# Altium footprint library HARTING THD.PcbLib: 113 footprints (part 10 of 11) (continued)
## HARTING_16 25 170 1301 000 [mm] "170 Poles, Piggyback Plug Connector (Basic Side)" (continued)
  round 1 hole 1.8 unplated mask+0.4: 171(-33.3,0) 172(33.3,0)
Top Overlay:
  lines w0.2: -34.95,-2.3 -34.95,2.2 cw(c-34.55,2.2) -34.55,2.6 -32.926,2.596 ccw(c-32.931,3.003) -32.525,3 -32.525,4.9 cw(c-32.025,4.9) -32.025,5.4 32.025,5.4 cw(c32.025,4.9) 32.525,4.9 32.525,3 ccw(c32.925,3) 32.925,2.6 34.55,2.6 cw(c34.55,2.2) 34.95,2.2 34.95,-2.75 ; -33.5,-15.5 ccw(c-33,-15.5) -33,-16 -32.525,-16 -32.525,-25.293 ccw(c-32.025,-25.293) -32.379,-25.646 -32.026,-25.994 ccw(c-31.718,-25.6) -31.718,-26.1 31.718,-26.1 ccw(c31.718,-25.6) 32.026,-25.994 32.379,-25.646 ccw(c32.025,-25.293) 32.525,-25.293 32.525,-16 33,-16 ccw(c33,-15.5) 33.5,-15.5 ; -33.5,-1.234 -33.5,-2 -33.1,-2 -33.1,-1.234 ; -33.5,1.234 -33.5,2 -33.1,2 -33.1,1.234 ; 33.1,-1.234 33.1,-2 33.5,-2 33.5,-1.234 ; 33.1,1.234 33.1,2 33.5,2 33.5,1.234 ; -31.74,-25.38 -31.74,-21.468 -31.26,-21.468 -31.26,-25.38 -31.74,-25.38 ; -30.99,-23.98 -30.99,-21.468 -30.51,-21.468 -30.51,-23.98 -30.99,-23.98 ; -30.24,-23.98 -29.76,-23.98 -29.76,-21.468 -30.24,-21.468 -30.24,-23.98 ; -29.49,-25.38 -29.01,-25.38 -29.01,-21.468 -29.49,-21.468 -29.49,-25.38 ; -28.74,-23.98 -28.74,-21.468 -28.26,-21.468 -28.26,-23.98 -28.74,-23.98 ; -27.99,-23.98 -27.51,-23.98 -27.51,-21.468 -27.99,-21.468 -27.99,-23.98 ; 27.51,-23.98 27.51,-21.468 27.99,-21.468 27.99,-23.98 27.51,-23.98 ; 28.26,-23.98 28.26,-21.468 28.74,-21.468 28.74,-23.98 28.26,-23.98 ; 29.01,-23.98 29.01,-21.468 29.49,-21.468 29.49,-23.98 29.01,-23.98 ; 29.76,-23.98 29.76,-21.468 30.24,-21.468 30.24,-23.98 29.76,-23.98 ; 30.51,-23.98 30.51,-21.468 30.99,-21.468 30.99,-23.98 30.51,-23.98 ; 31.26,-25.38 31.26,-21.468 31.74,-21.468 31.74,-25.38 31.26,-25.38
  text "1" at 33.25,3.3 h1.2
Mechanical 8:
  drawing of 735 lines, arcs and shapes, not listed
  text "86" at -31.156,-2.186 h0.5
  text "89" at -28.931,-2.226 h0.5
  text "88" at -29.75,-0.85 h0.5
  text "87" at -30.405,0.369 h0.5
  text "85" at -31.097,1.636 h0.5
  text "84" at -30.367,2.938 h0.5
  text "83" at -29.713,4.371 h0.5
  text "82" at -28.854,1.645 h0.5
  text "2" at 31.189,4.373 h0.5
  text "3" at 30.339,3.029 h0.5
  text "4" at 29.53,1.748 h0.5
  text "1" at 31.62,1.758 h0.5
  text "168" at 30.244,0.414 h0.5
  text "169" at 30.879,-0.767 h0.5
  text "170" at 31.69,-2.201 h0.5
  text "167" at 29.553,-2.214 h0.5
  text "PCB Edge" at -5.2,-14.4 h1.52
Mechanical 14:
  circle w0.1: c-33.645,-7.5 r0.735
  circle w0.1: c33.645,-7.5 r0.735
  lines w0.1: -34.95,-6.5 cw(c-34.45,-6.5) -34.45,-6 -32.65,-6 cw(c-32.65,-6.5) -32.15,-6.5 -32.15,-8.5 cw(c-32.65,-8.5) -32.65,-9 -34.45,-9 cw(c-34.45,-8.5) -34.95,-8.5 -34.95,2.2 cw(c-34.55,2.2) -34.55,2.6 -32.926,2.596 ccw(c-32.931,3.003) -32.525,3 -32.525,4.9 cw(c-32.025,4.9) -32.025,5.4 32.025,5.4 cw(c32.025,4.9) 32.525,4.9 32.525,3 ccw(c32.925,3) 32.925,2.6 34.55,2.6 cw(c34.55,2.2) 34.95,2.2 34.95,-8.5 cw(c34.45,-8.5) 34.45,-9 32.65,-9 cw(c32.65,-8.5) 32.15,-8.5 32.15,-6.5 cw(c32.65,-6.5) 32.65,-6 34.45,-6 cw(c34.45,-6.5) 34.95,-6.5 ; -34.95,1.784 -33.5,1.784 ; -33.1,1.784 -32.025,1.784 -32.025,4.8 32.025,4.8 32.025,1.784 33.1,1.784 ; -32.825,-9 cw(c-32.825,-9.3) -32.525,-9.3 -32.525,-25.293 ccw(c-32.025,-25.293) -32.379,-25.646 -32.026,-25.994 ccw(c-31.718,-25.6) -31.718,-26.1 31.718,-26.1 ccw(c31.718,-25.6) 32.026,-25.994 32.379,-25.646 ccw(c32.025,-25.293) 32.525,-25.293 32.525,-9.3 cw(c32.825,-9.3) 32.825,-9 ; -16,4.779 -16,2.546 -15.5,2.546 -15.5,4.8 ; -0.25,4.8 -0.25,2.546 0.25,2.546 0.25,4.8 ; 15.5,4.8 15.5,2.546 16,2.546 16,4.8 ; 33.5,1.784 34.95,1.784 ; -33.5,-2 -33.5,2 -33.1,2 -33.1,-2 -33.5,-2 ; -31.74,-25.38 -31.26,-25.38 -31.26,-21.468 -31.74,-21.468 -31.74,-25.38 ; -30.99,-23.98 -30.51,-23.98 -30.51,-21.468 -30.99,-21.468 -30.99,-23.98 ; -30.24,-23.98 -30.24,-21.468 -29.76,-21.468 -29.76,-23.98 -30.24,-23.98 ; -29.49,-25.38 -29.49,-21.468 -29.01,-21.468 -29.01,-25.38 -29.49,-25.38 ; -28.74,-23.98 -28.26,-23.98 -28.26,-21.468 -28.74,-21.468 -28.74,-23.98 ; -27.99,-23.98 -27.99,-21.468 -27.51,-21.468 -27.51,-23.98 -27.99,-23.98 ; 27.51,-23.98 27.99,-23.98 27.99,-21.468 27.51,-21.468 27.51,-23.98 ; 28.26,-23.98 28.74,-23.98 28.74,-21.468 28.26,-21.468 28.26,-23.98 ; 29.01,-23.98 29.49,-23.98 29.49,-21.468 29.01,-21.468 29.01,-23.98 ; 29.76,-23.98 30.24,-23.98 30.24,-21.468 29.76,-21.468 29.76,-23.98 ; 30.51,-23.98 30.99,-23.98 30.99,-21.468 30.51,-21.468 30.51,-23.98 ; 31.26,-25.38 31.74,-25.38 31.74,-21.468 31.26,-21.468 31.26,-25.38 ; 33.1,-2 33.5,-2 33.5,2 33.1,2 33.1,-2
  text "1" at 33.25,3.3 h1.2
3D body "HARTING_16 25 170 1301 000.stp": height 7.59, standoff -2.63, extent -34.95,-26.1 34.95,5.4

## HARTING_16 33 096 1201 000 [mm] "Thru-Hole Press-in Terminations, Lead 3.7 mm, 96 Positions (72+24), Straight Micro TCA Female Connector"
height 17.2
pads (168):
  round 1.1 hole 0.6: A1(11.12,-21.25) A2(11.12,-23.25) A3(11.12,-25.25) A4(11.12,-27.25) A5(11.12,-29.25) A6(11.12,-31.25) A7(11.12,-33.25) A8(11.12,-35.25) A9(11.12,-37.25) B1(9.12,-21.25) B2(9.12,-23.25) B3(9.12,-25.25) B4(9.12,-27.25) B5(9.12,-29.25) B6(9.12,-31.25) B7(9.12,-33.25) B8(9.12,-35.25) B9(9.12,-37.25) C1(7.12,-21.25) C2(7.12,-23.25) C3(7.12,-25.25) C4(7.12,-27.25) C5(7.12,-29.25) C6(7.12,-31.25) C7(7.12,-33.25) C8(7.12,-35.25) C9(7.12,-37.25) D1(5.12,-21.25) D2(5.12,-23.25) D3(5.12,-25.25) D4(5.12,-27.25) D5(5.12,-29.25) D6(5.12,-31.25) D7(5.12,-33.25) D8(5.12,-35.25) D9(5.12,-37.25) E1(3.12,-21.25) E2(3.12,-23.25) E3(3.12,-25.25) E4(3.12,-27.25) E5(3.12,-29.25) E6(3.12,-31.25) E7(3.12,-33.25) E8(3.12,-35.25) E9(3.12,-37.25) F1(1.12,-21.25) F2(1.12,-23.25) F3(1.12,-25.25) F4(1.12,-27.25) F5(1.12,-29.25) F6(1.12,-31.25) F7(1.12,-33.25) F8(1.12,-35.25) F9(1.12,-37.25) G1(-0.88,-21.25) G2(-0.88,-23.25) G3(-0.88,-25.25) G4(-0.88,-27.25) G5(-0.88,-29.25) G6(-0.88,-31.25) G7(-0.88,-33.25) G8(-0.88,-35.25) G9(-0.88,-37.25) H1(-2.88,-21.25) H2(-2.88,-23.25) H3(-2.88,-25.25) H4(-2.88,-27.25) H5(-2.88,-29.25) H6(-2.88,-31.25) H7(-2.88,-33.25) H8(-2.88,-35.25) H9(-2.88,-37.25) P1(2.25,16.5) P1(4.25,16.5) P1(7.25,16.5) P1(9.25,16.5) P2(2.25,13.5) P2(4.25,13.5) P2(7.25,13.5) P2(9.25,13.5) P3(2.25,10.5) P3(4.25,10.5) P3(7.25,10.5) P3(9.25,10.5) P4(2.25,7.5) P4(4.25,7.5) P4(7.25,7.5) P4(9.25,7.5) P5(2.25,4.5) P5(4.25,4.5) P5(7.25,4.5) P5(9.25,4.5) P6(2.25,1.5) P6(4.25,1.5) P6(7.25,1.5) P6(9.25,1.5) P7(2.25,-1.5) P7(4.25,-1.5) P7(7.25,-1.5) P7(9.25,-1.5) P8(2.25,-4.5) P8(4.25,-4.5) P8(7.25,-4.5) P8(9.25,-4.5) P9(2.25,-7.5) P9(4.25,-7.5) P9(7.25,-7.5) P9(9.25,-7.5) P10(2.25,-10.5) P10(4.25,-10.5) P10(7.25,-10.5) P10(9.25,-10.5) P11(2.25,-13.5) P11(4.25,-13.5) P11(7.25,-13.5) P11(9.25,-13.5) P12(2.25,-16.5) P12(4.25,-16.5) P12(7.25,-16.5) P12(9.25,-16.5) P13(-9.25,16.5) P13(-7.25,16.5) P13(-4.25,16.5) P13(-2.25,16.5) P14(-9.25,13.5) P14(-7.25,13.5) P14(-4.25,13.5) P14(-2.25,13.5) P15(-9.25,10.5) P15(-7.25,10.5) P15(-4.25,10.5) P15(-2.25,10.5) P16(-9.25,7.5) P16(-7.25,7.5) P16(-4.25,7.5) P16(-2.25,7.5) P17(-9.25,4.5) P17(-7.25,4.5) P17(-4.25,4.5) P17(-2.25,4.5) P18(-9.25,1.5) P18(-7.25,1.5) P18(-4.25,1.5) P18(-2.25,1.5) P19(-9.25,-1.5) P19(-7.25,-1.5) P19(-4.25,-1.5) P19(-2.25,-1.5) P20(-9.25,-4.5) P20(-7.25,-4.5) P20(-4.25,-4.5) P20(-2.25,-4.5) P21(-9.25,-7.5) P21(-7.25,-7.5) P21(-4.25,-7.5) P21(-2.25,-7.5) P22(-9.25,-10.5) P22(-7.25,-10.5) P22(-4.25,-10.5) P22(-2.25,-10.5) P23(-9.25,-13.5) P23(-7.25,-13.5) P23(-4.25,-13.5) P23(-2.25,-13.5) P24(-9.25,-16.5) P24(-7.25,-16.5) P24(-4.25,-16.5) P24(-2.25,-16.5)
Top Overlay:
  circle w0.2: c-9.5,-34.75 r1.99
  circle w0.2: c-9.5,-34.75 r0.99
  lines w0.2: -11.65,-18.9 -8.65,-18.9 -8.65,-17.78 -5.92,-17.78 -5.92,-40.7 ; -11.65,20.4 -7.67,20.4 ; -10.65,20.4 -10.65,21.45 cw(c-9.66,21.45) -8.67,21.45 -8.67,20.4 ; -5.92,-18.9 -4.97,-18.9 ; 11.65,-18.9 11.65,20.4 8.65,20.4 8.65,19.48 1.5,19.48 1.5,20.4 -1.5,20.4 -1.5,19.48 -7.67,19.48 -7.67,21.45 ccw(c-9.66,21.45) -11.65,21.45 -11.65,-40.7 13.69,-40.7 13.69,-18.9 8.65,-18.9 8.65,-17.78 -4.97,-17.78 -4.97,-39.5 13.02,-39.5 13.02,-18.9
  text "P24" at -12.25,-17.88 h1.2
  text "P13" at -12.25,15.275 h1.2
  text "P12" at 13.45,-17.736 h1.2
  text "P1" at 13.45,15.72 h1.2
  text "9" at 15.42,-37.69 h1.2
  text "8" at 15.42,-35.67 h1.2
  text "7" at 15.42,-33.67 h1.2
  text "6" at 15.42,-31.664 h1.2
  text "5" at 15.42,-29.695 h1.2
  text "4" at 15.42,-27.73 h1.2
  text "3" at 15.42,-25.695 h1.2
  text "2" at 15.42,-23.691 h1.2
  text "1" at 15.42,-21.55 h1.2
  text "A" at 11.72,-42.042 h1.2
  text "B" at 9.72,-42.042 h1.2
  text "C" at 7.72,-42.042 h1.2
  text "D" at 5.72,-42.07 h1.2
  text "E" at 3.72,-42.07 h1.2
  text "F" at 1.72,-42.07 h1.2
  text "G" at -0.28,-42.099 h1.2
  text "H" at -2.28,-42.099 h1.2
Mechanical 8:
  drawing of 676 lines, arcs and shapes, not listed
Mechanical 14:
  drawing of 158 lines, arcs and shapes, not listed
  text "B" at 7.8,18.108 h0.9
  text "C" at 4.85,18.108 h0.9
  text "D" at 2.9,18.108 h0.9
  text "A" at 9.6,18.1 h0.9
  text "A" at -1.9,18.1 h0.9
  text "D" at -8.6,18.108 h0.9
  text "C" at -6.65,18.108 h0.9
  text "B" at -3.7,18.108 h0.9
  text "P24" at -10.2,-18.1 h0.9
  text "P23" at -10.15,-14.845 h0.9
  text "P22" at -10.15,-11.856 h0.9
  text "P21" at -10.15,-8.7 h0.9
  text "P20" at -10.15,-5.82 h0.9
  text "P19" at -10.15,-2.743 h0.9
  text "P18" at -10.15,0.3 h0.9
  text "P17" at -10.15,3.3 h0.9
  text "P16" at -10.15,6.27 h0.9
  text "P15" at -10.15,9.275 h0.9
  text "P14" at -10.15,12.24 h0.9
  text "P13" at -10.15,15.275 h0.9
  text "P12" at 11.35,-17.736 h0.9
  text "P11" at 11.35,-14.58 h0.9
  text "P10" at 11.35,-11.7 h0.9
  text "P9" at 11.35,-8.443 h0.9
  text "P8" at 11.35,-5.4 h0.9
  text "P7" at 11.35,-2.4 h0.9
  text "P6" at 11.35,0.57 h0.9
  text "P5" at 11.35,3.575 h0.9
  text "P4" at 11.35,6.54 h0.9
  text "P3" at 11.35,9.575 h0.9
  text "P2" at 11.35,12.564 h0.9
  text "P1" at 11.35,15.72 h0.9
  text "1" at 12.72,-21.55 h0.9
  text "2" at 12.72,-23.691 h0.9
  text "3" at 12.72,-25.695 h0.9
  text "4" at 12.72,-27.73 h0.9
  text "5" at 12.72,-29.695 h0.9
  text "6" at 12.72,-31.664 h0.9
  text "7" at 12.72,-33.67 h0.9
  text "8" at 12.72,-35.67 h0.9
  text "9" at 12.72,-37.69 h0.9
  text "H" at -2.28,-39.16 h0.9
  text "G" at -0.28,-39.17 h0.9
  text "F" at 1.72,-39.16 h0.9
  text "E" at 3.72,-39.16 h0.9
  text "D" at 5.72,-39.17 h0.9
  text "C" at 7.72,-39.17 h0.9
  text "B" at 9.72,-39.16 h0.9
  text "A" at 11.72,-39.17 h0.9
Drill Drawing:
  lines w0.1: -11.65,-17.836 -11.65,18.4 11,18.4 11,-18.9 12.7,-18.9 12.7,-38.47 -4.3,-38.47 -4.3,-17.78 -11.65,-17.78
  text "PRESS-FIT TECHNOLOGY  diam. 0.6mm +0.05 -0" at 0.3,-18.7 h1
3D body "HARTING_16 33 096 1201 000.stp": height 17, standoff -3.7, extent -11.65,-40.7 13.69,23.44

## HARTING_16 79 000 0020 000 [mm] "Quad Length (22.5mm) Stacking Pin For 1x AdvancedMC Basic Side + 2x MCH-Plug Basic Side + 1x Piggyback Connector (Basic Side)"
height 22.5
Top Overlay:
  circle w0.2: c0,0 r0.75
Mechanical 8:
  lines w0.1: -0.5,0 0,0 ; 0,-0.5 0,0 ; 0,0.5 0,0 ; 0.5,0 0,0
Mechanical 14:
  circle w0.1: c0,0 r0.75
3D body "HARTING_16 79 000 0020 000.stp": height 22.5, standoff 0, extent -0.75,-0.75 0.75,0.75

## HARTING_17 05 095 1201 [mm] "Har-bus HM Type B19, 95 Contacts (abcde), Pitch 2mm, 3.7mm Press-in Terminations, Male Straight Connector (VME, Position P0)"
height 13.4
pads (95):
  round 1.1 hole 0.6: a1(0,0) a2(0,-2) a3(0,-4) a4(0,-6) a5(0,-8) a6(0,-10) a7(0,-12) a8(0,-14) a9(0,-16) a10(0,-18) a11(0,-20) a12(0,-22) a13(0,-24) a14(0,-26) a15(0,-28) a16(0,-30) a17(0,-32) a18(0,-34) a19(0,-36) b1(2,0) b2(2,-2) b3(2,-4) b4(2,-6) b5(2,-8) b6(2,-10) b7(2,-12) b8(2,-14) b9(2,-16) b10(2,-18) b11(2,-20) b12(2,-22) b13(2,-24) b14(2,-26) b15(2,-28) b16(2,-30) b17(2,-32) b18(2,-34) b19(2,-36) c1(4,0) c2(4,-2) c3(4,-4) c4(4,-6) c5(4,-8) c6(4,-10) c7(4,-12) c8(4,-14) c9(4,-16) c10(4,-18) c11(4,-20) c12(4,-22) c13(4,-24) c14(4,-26) c15(4,-28) c16(4,-30) c17(4,-32) c18(4,-34) c19(4,-36) d1(6,0) d2(6,-2) d3(6,-4) d4(6,-6) d5(6,-8) d6(6,-10) d7(6,-12) d8(6,-14) d9(6,-16) d10(6,-18) d11(6,-20) d12(6,-22) d13(6,-24) d14(6,-26) d15(6,-28) d16(6,-30) d17(6,-32) d18(6,-34) d19(6,-36) e1(8,0) e2(8,-2) e3(8,-4) e4(8,-6) e5(8,-8) e6(8,-10) e7(8,-12) e8(8,-14) e9(8,-16) e10(8,-18) e11(8,-20) e12(8,-22) e13(8,-24) e14(8,-26) e15(8,-28) e16(8,-30) e17(8,-32) e18(8,-34) e19(8,-36)
Top Overlay:
  drawing of 166 lines, arcs and shapes, not listed
  text "e" at 7.667,1.667 h1.2
  text "a" at -0.333,1.667 h1.2
  text "b" at 1.667,1.5 h1.2
  text "c" at 3.667,1.667 h1.2
  text "d" at 5.667,1.5 h1.2
  text "1" at -4.7,-0.3 h1.2
  text "19" at -6.2,-36.6 h1.2
Mechanical 8:
  lines w0.05: -0.5,-36 0,-36 ; -0.5,-34 0,-34 ; -0.5,-2 0,-2 ; -0.5,0 0,0 ; 0,-36.5 0,-36 ; 0,-35.5 0,-36 ; 0,-34.5 0,-34 ; 0,-33.5 0,-34 ; 0,-2.5 0,-2 ; 0,-1.5 0,-2 ; 0,-0.5 0,0 ; 0,0.5 0,0 ; 0.5,-36 0,-36 ; 0.5,-34 0,-34 ; 0.5,-2 0,-2 ; 0.5,0 0,0 ; 1.5,-36 2,-36 ; 1.5,-34 2,-34 ; 1.5,-2 2,-2 ; 1.5,0 2,0 ; 2,-36.5 2,-36 ; 2,-35.5 2,-36 ; 2,-34.5 2,-34 ; 2,-33.5 2,-34 ; 2,-2.5 2,-2 ; 2,-1.5 2,-2 ; 2,-0.5 2,0 ; 2,0.5 2,0 ; 2.5,-36 2,-36 ; 2.5,-34 2,-34 ; 2.5,-2 2,-2 ; 2.5,0 2,0 ; 3.5,-36 4,-36 ; 3.5,-34 4,-34 ; 3.5,-18 4,-18 ; 3.5,-2 4,-2 ; 3.5,0 4,0 ; 4,-36.5 4,-36 ; 4,-35.5 4,-36 ; 4,-34.5 4,-34 ; 4,-33.5 4,-34 ; 4,-18.5 4,-18 ; 4,-17.5 4,-18 ; 4,-2.5 4,-2 ; 4,-1.5 4,-2 ; 4,-0.5 4,0 ; 4,0.5 4,0 ; 4.5,-36 4,-36 ; 4.5,-34 4,-34 ; 4.5,-18 4,-18 ; 4.5,-2 4,-2 ; 4.5,0 4,0 ; 5.5,-36 6,-36 ; 5.5,-34 6,-34 ; 5.5,-2 6,-2 ; 5.5,0 6,0 ; 6,-36.5 6,-36 ; 6,-35.5 6,-36 ; 6,-34.5 6,-34 ; 6,-33.5 6,-34 ; 6,-2.5 6,-2 ; 6,-1.5 6,-2 ; 6,-0.5 6,0 ; 6,0.5 6,0 ; 6.5,-36 6,-36 ; 6.5,-34 6,-34 ; 6.5,-2 6,-2 ; 6.5,0 6,0 ; 7.5,-36 8,-36 ; 7.5,-34 8,-34 ; 7.5,-2 8,-2 ; 7.5,0 8,0 ; 8,-36.5 8,-36 ; 8,-35.5 8,-36 ; 8,-34.5 8,-34 ; 8,-33.5 8,-34 ; 8,-2.5 8,-2 ; 8,-1.5 8,-2 ; 8,-0.5 8,0 ; 8,0.5 8,0 ; 8.5,-36 8,-36 ; 8.5,-34 8,-34 ; 8.5,-2 8,-2 ; 8.5,0 8,0
Mechanical 14:
  drawing of 186 lines, arcs and shapes, not listed
  text "e" at 7.667,1.667 h1.2
  text "1" at -4.7,-0.3 h1.2
  text "d" at 5.667,1.5 h1.2
  text "c" at 3.667,1.667 h1.2
  text "b" at 1.667,1.5 h1.2
  text "a" at -0.333,1.667 h1.2
  text "19" at -6.2,-36.6 h1.2
Drill Drawing:
  lines w0.1: -1,-37 9,-37 9,1 -1,1 -1,-37
  text "PRESS-FIT TECHNOLOGY diam. 0.6mm +/- 0.05" at 10.55,-36.375 h1
3D body "HARTING_17 05 095 1201.stp": height 13.4, standoff -3.7, extent -3.7,-37 11.7,1

## HARTING_17 25 095 2101 [mm] "Type B19, 95 Contacts (abcde) Female Connector, Angled, HAR-BUS HM without Upper Shield (VME, Position P0)"
height 7.3
pads (95):
  round 1.1 hole 0.6: a1(0,0) a2(0,-2) a3(0,-4) a4(0,-6) a5(0,-8) a6(0,-10) a7(0,-12) a8(0,-14) a9(0,-16) a10(0,-18) a11(0,-20) a12(0,-22) a13(0,-24) a14(0,-26) a15(0,-28) a16(0,-30) a17(0,-32) a18(0,-34) a19(0,-36) b1(-2,0) b2(-2,-2) b3(-2,-4) b4(-2,-6) b5(-2,-8) b6(-2,-10) b7(-2,-12) b8(-2,-14) b9(-2,-16) b10(-2,-18) b11(-2,-20) b12(-2,-22) b13(-2,-24) b14(-2,-26) b15(-2,-28) b16(-2,-30) b17(-2,-32) b18(-2,-34) b19(-2,-36) c1(-4,0) c2(-4,-2) c3(-4,-4) c4(-4,-6) c5(-4,-8) c6(-4,-10) c7(-4,-12) c8(-4,-14) c9(-4,-16) c10(-4,-18) c11(-4,-20) c12(-4,-22) c13(-4,-24) c14(-4,-26) c15(-4,-28) c16(-4,-30) c17(-4,-32) c18(-4,-34) c19(-4,-36) d1(-6,0) d2(-6,-2) d3(-6,-4) d4(-6,-6) d5(-6,-8) d6(-6,-10) d7(-6,-12) d8(-6,-14) d9(-6,-16) d10(-6,-18) d11(-6,-20) d12(-6,-22) d13(-6,-24) d14(-6,-26) d15(-6,-28) d16(-6,-30) d17(-6,-32) d18(-6,-34) d19(-6,-36) e1(-8,0) e2(-8,-2) e3(-8,-4) e4(-8,-6) e5(-8,-8) e6(-8,-10) e7(-8,-12) e8(-8,-14) e9(-8,-16) e10(-8,-18) e11(-8,-20) e12(-8,-22) e13(-8,-24) e14(-8,-26) e15(-8,-28) e16(-8,-30) e17(-8,-32) e18(-8,-34) e19(-8,-36)
Top Overlay:
  lines w0.2: 9.7,-36.95 9.7,0.95 ; 10.3,-36.95 10.3,0.95 ; -9.75,-36.95 10.7,-36.95 10.7,0.95 -9.75,0.95 -9.75,-36.95
  text "a" at -0.333,1.667 h1.2
  text "b" at -2.333,1.5 h1.2
  text "c" at -4.333,1.667 h1.2
  text "d" at -6.333,1.5 h1.2
  text "e" at -8.333,1.667 h1.2
  text "1" at -10.225,-0.25 h1.2
  text "19" at -10.225,-36.833 h1.2
Mechanical 8:
  lines w0.1: -8.5,-36 -8,-36 ; -8.5,0 -8,0 ; -8,-36.5 -8,-36 ; -8,-35.5 -8,-36 ; -8,-0.5 -8,0 ; -8,0.5 -8,0 ; -7.5,-36 -8,-36 ; -7.5,0 -8,0 ; -6.5,-36 -6,-36 ; -6.5,0 -6,0 ; -6,-36.5 -6,-36 ; -6,-35.5 -6,-36 ; -6,-0.5 -6,0 ; -6,0.5 -6,0 ; -5.5,-36 -6,-36 ; -5.5,0 -6,0 ; -4.5,-36 -4,-36 ; -4.5,0 -4,0 ; -4,-36.5 -4,-36 ; -4,-35.5 -4,-36 ; -4,-0.5 -4,0 ; -4,0.5 -4,0 ; -3.5,-36 -4,-36 ; -3.5,0 -4,0 ; -2.5,-36 -2,-36 ; -2.5,0 -2,0 ; -2,-36.5 -2,-36 ; -2,-35.5 -2,-36 ; -2,-0.5 -2,0 ; -2,0.5 -2,0 ; -1.5,-36 -2,-36 ; -1.5,0 -2,0 ; -0.5,-36 0,-36 ; -0.5,0 0,0 ; 0,-36.5 0,-36 ; 0,-35.5 0,-36 ; 0,-0.5 0,0 ; 0,0.5 0,0 ; 0.5,-36 0,-36 ; 0.5,0 0,0 ; 1.5,-36.95 1.5,-18 1.5,0.95
  text "PCB" at 0.5,-20 h1.2
Mechanical 14:
  lines w0.1: 9.7,-36.95 9.7,0.95 ; 10.3,-36.95 10.3,0.95 ; -9.75,-36.95 10.7,-36.95 10.7,0.95 -9.75,0.95 -9.75,-36.95
  text "19" at -10.225,-36.833 h1.2
  text "1" at -10.225,-0.25 h1.2
  text "e" at -8.333,1.667 h1.2
  text "d" at -6.333,1.5 h1.2
  text "c" at -4.333,1.667 h1.2
  text "b" at -2.333,1.5 h1.2
  text "a" at -0.333,1.667 h1.2
Drill Drawing:
  lines w0.1: -9.75,-37 1,-37 1,1 -9.75,1 -9.75,-37
  text "PRESS-FIT TECHNOLOGY diam. 0.6mm +/- 0.05" at 2.55,-36.375 h1
3D body "HARTING_17 25 095 2101.stp": height 7.68, standoff -3.67, extent -9.75,-36.95 10.7,0.95

## HARTING_17 25 095 2101_a [mm] "Type B19, 95 Contacts (abcde) Female Connector, Angled, HAR-BUS HM without Upper Shield (VME, Position P0), (Footprint for Rear Transition Module (RTM))"
height 7.3
pads (190):
  round 1.1 hole 0.6: a1(-25.7,-0.2) a1(0,0) a2(-25.7,-2.2) a2(0,-2) a3(-25.7,-4.2) a3(0,-4) a4(-25.7,-6.2) a4(0,-6) a5(-25.7,-8.2) a5(0,-8) a6(-25.7,-10.2) a6(0,-10) a7(-25.7,-12.2) a7(0,-12) a8(-25.7,-14.2) a8(0,-14) a9(-25.7,-16.2) a9(0,-16) a10(-25.7,-18.2) a10(0,-18) a11(-25.7,-20.2) a11(0,-20) a12(-25.7,-22.2) a12(0,-22) a13(-25.7,-24.2) a13(0,-24) a14(-25.7,-26.2) a14(0,-26) a15(-25.7,-28.2) a15(0,-28) a16(-25.7,-30.2) a16(0,-30) a17(-25.7,-32.2) a17(0,-32) a18(-25.7,-34.2) a18(0,-34) a19(-25.7,-36.2) a19(0,-36) b1(-27.7,-0.2) b1(2,0) b2(-27.7,-2.2) b2(2,-2) b3(-27.7,-4.2) b3(2,-4) b4(-27.7,-6.2) b4(2,-6) b5(-27.7,-8.2) b5(2,-8) b6(-27.7,-10.2) b6(2,-10) b7(-27.7,-12.2) b7(2,-12) b8(-27.7,-14.2) b8(2,-14) b9(-27.7,-16.2) b9(2,-16) b10(-27.7,-18.2) b10(2,-18) b11(-27.7,-20.2) b11(2,-20) b12(-27.7,-22.2) b12(2,-22) b13(-27.7,-24.2) b13(2,-24) b14(-27.7,-26.2) b14(2,-26) b15(-27.7,-28.2) b15(2,-28) b16(-27.7,-30.2) b16(2,-30) b17(-27.7,-32.2) b17(2,-32) b18(-27.7,-34.2) b18(2,-34) b19(-27.7,-36.2) b19(2,-36) c1(-29.7,-0.2) c1(4,0) c2(-29.7,-2.2) c2(4,-2) c3(-29.7,-4.2) c3(4,-4) c4(-29.7,-6.2) c4(4,-6) c5(-29.7,-8.2) c5(4,-8) c6(-29.7,-10.2) c6(4,-10) c7(-29.7,-12.2) c7(4,-12) c8(-29.7,-14.2) c8(4,-14) c9(-29.7,-16.2) c9(4,-16) c10(-29.7,-18.2) c10(4,-18) c11(-29.7,-20.2) c11(4,-20) c12(-29.7,-22.2) c12(4,-22) c13(-29.7,-24.2) c13(4,-24) c14(-29.7,-26.2) c14(4,-26) c15(-29.7,-28.2) c15(4,-28) c16(-29.7,-30.2) c16(4,-30) c17(-29.7,-32.2) c17(4,-32) c18(-29.7,-34.2) c18(4,-34) c19(-29.7,-36.2) c19(4,-36) d1(-31.7,-0.2) d1(6,0) d2(-31.7,-2.2) d2(6,-2) d3(-31.7,-4.2) d3(6,-4) d4(-31.7,-6.2) d4(6,-6) d5(-31.7,-8.2) d5(6,-8) d6(-31.7,-10.2) d6(6,-10) d7(-31.7,-12.2) d7(6,-12) d8(-31.7,-14.2) d8(6,-14) d9(-31.7,-16.2) d9(6,-16) d10(-31.7,-18.2) d10(6,-18) d11(-31.7,-20.2) d11(6,-20) d12(-31.7,-22.2) d12(6,-22) d13(-31.7,-24.2) d13(6,-24) d14(-31.7,-26.2) d14(6,-26) d15(-31.7,-28.2) d15(6,-28) d16(-31.7,-30.2) d16(6,-30) d17(-31.7,-32.2) d17(6,-32) d18(-31.7,-34.2) d18(6,-34) d19(-31.7,-36.2) d19(6,-36) e1(-33.7,-0.2) e1(8,0) e2(-33.7,-2.2) e2(8,-2) e3(-33.7,-4.2) e3(8,-4) e4(-33.7,-6.2) e4(8,-6) e5(-33.7,-8.2) e5(8,-8) e6(-33.7,-10.2) e6(8,-10) e7(-33.7,-12.2) e7(8,-12) e8(-33.7,-14.2) e8(8,-14) e9(-33.7,-16.2) e9(8,-16) e10(-33.7,-18.2) e10(8,-18) e11(-33.7,-20.2) e11(8,-20) e12(-33.7,-22.2) e12(8,-22) e13(-33.7,-24.2) e13(8,-24) e14(-33.7,-26.2) e14(8,-26) e15(-33.7,-28.2) e15(8,-28) e16(-33.7,-30.2) e16(8,-30) e17(-33.7,-32.2) e17(8,-32) e18(-33.7,-34.2) e18(8,-34) e19(-33.7,-36.2) e19(8,-36)
Top Overlay:
  lines w0.2: -16,-37.15 -16,0.75 ; -15.4,-37.15 -15.4,0.75 ; -10.3,-36.95 -10.3,0.95 ; -9.7,-36.95 -9.7,0.95 ; -35.45,-37.15 -15,-37.15 -15,0.75 -35.45,0.75 -35.45,-37.15 ; -10.7,-36.95 -10.7,0.95 9.75,0.95 9.75,-36.95 -10.7,-36.95
  text "a" at -0.333,1.667 h1.2
  text "b" at 1.667,1.5 h1.2
  text "c" at 3.667,1.667 h1.2
  text "d" at 5.667,1.5 h1.2
  text "e" at 7.667,1.667 h1.2
  text "1" at 11.6,-0.2 h1.2
  text "19" at 11.475,-36.633 h1.2
  text "a" at -26.033,1.467 h1.2
  text "b" at -28.033,1.3 h1.2
  text "c" at -30.033,1.467 h1.2
  text "d" at -32.033,1.3 h1.2
  text "e" at -34.033,1.467 h1.2
  text "1" at -35.925,-0.45 h1.2
  text "19" at -35.925,-37.033 h1.2
Mechanical 8:
  lines w0.1: -34.2,-36.2 -33.7,-36.2 ; -34.2,-0.2 -33.7,-0.2 ; -33.7,-36.7 -33.7,-36.2 ; -33.7,-35.7 -33.7,-36.2 ; -33.7,-0.7 -33.7,-0.2 ; -33.7,0.3 -33.7,-0.2 ; -33.2,-36.2 -33.7,-36.2 ; -33.2,-0.2 -33.7,-0.2 ; -32.2,-36.2 -31.7,-36.2 ; -32.2,-0.2 -31.7,-0.2 ; -31.7,-36.7 -31.7,-36.2 ; -31.7,-35.7 -31.7,-36.2 ; -31.7,-0.7 -31.7,-0.2 ; -31.7,0.3 -31.7,-0.2 ; -31.2,-36.2 -31.7,-36.2 ; -31.2,-0.2 -31.7,-0.2 ; -30.2,-36.2 -29.7,-36.2 ; -30.2,-0.2 -29.7,-0.2 ; -29.7,-36.7 -29.7,-36.2 ; -29.7,-35.7 -29.7,-36.2 ; -29.7,-0.7 -29.7,-0.2 ; -29.7,0.3 -29.7,-0.2 ; -29.2,-36.2 -29.7,-36.2 ; -29.2,-0.2 -29.7,-0.2 ; -28.2,-36.2 -27.7,-36.2 ; -28.2,-0.2 -27.7,-0.2 ; -27.7,-36.7 -27.7,-36.2 ; -27.7,-35.7 -27.7,-36.2 ; -27.7,-0.7 -27.7,-0.2 ; -27.7,0.3 -27.7,-0.2 ; -27.2,-36.2 -27.7,-36.2 ; -27.2,-0.2 -27.7,-0.2 ; -26.2,-36.2 -25.7,-36.2 ; -26.2,-0.2 -25.7,-0.2 ; -25.7,-36.7 -25.7,-36.2 ; -25.7,-35.7 -25.7,-36.2 ; -25.7,-0.7 -25.7,-0.2 ; -25.7,0.3 -25.7,-0.2 ; -25.2,-36.2 -25.7,-36.2 ; -25.2,-0.2 -25.7,-0.2 ; -24.2,-37.15 -24.2,-18.2 -24.2,0.75 ; -1.5,-36.95 -1.5,-18 -1.5,0.95 ; -0.5,-36 0,-36 ; -0.5,0 0,0 ; 0,-36.5 0,-36 ; 0,-35.5 0,-36 ; 0,-0.5 0,0 ; 0,0.5 0,0 ; 0.5,-36 0,-36 ; 0.5,0 0,0 ; 1.5,-36 2,-36 ; 1.5,0 2,0 ; 2,-36.5 2,-36 ; 2,-35.5 2,-36 ; 2,-0.5 2,0 ; 2,0.5 2,0 ; 2.5,-36 2,-36 ; 2.5,0 2,0 ; 3.5,-36 4,-36 ; 3.5,0 4,0 ; 4,-36.5 4,-36 ; 4,-35.5 4,-36 ; 4,-0.5 4,0 ; 4,0.5 4,0 ; 4.5,-36 4,-36 ; 4.5,0 4,0 ; 5.5,-36 6,-36 ; 5.5,0 6,0 ; 6,-36.5 6,-36 ; 6,-35.5 6,-36 ; 6,-0.5 6,0 ; 6,0.5 6,0 ; 6.5,-36 6,-36 ; 6.5,0 6,0 ; 7.5,-36 8,-36 ; 7.5,0 8,0 ; 8,-36.5 8,-36 ; 8,-35.5 8,-36 ; 8,-0.5 8,0 ; 8,0.5 8,0 ; 8.5,-36 8,-36 ; 8.5,0 8,0
  text "PCB" at -2.3,-19.6 h1.2
  text "PCB" at -25.2,-20.2 h1.2
Mechanical 14:
  lines w0.1: -16,-37.15 -16,0.75 ; -15.4,-37.15 -15.4,0.75 ; -10.3,-36.95 -10.3,0.95 ; -9.7,-36.95 -9.7,0.95 ; -35.45,-37.15 -15,-37.15 -15,0.75 -35.45,0.75 -35.45,-37.15 ; -10.7,-36.95 -10.7,0.95 9.75,0.95 9.75,-36.95 -10.7,-36.95
  text "a" at -0.333,1.667 h1.2
  text "b" at 1.667,1.5 h1.2
  text "c" at 3.667,1.667 h1.2
  text "d" at 5.667,1.5 h1.2
  text "e" at 7.667,1.667 h1.2
  text "1" at 11.6,-0.2 h1.2
  text "19" at 11.475,-36.633 h1.2
  text "19" at -35.925,-37.033 h1.2
  text "1" at -35.925,-0.45 h1.2
  text "e" at -34.033,1.467 h1.2
  text "d" at -32.033,1.3 h1.2
  text "c" at -30.033,1.467 h1.2
  text "b" at -28.033,1.3 h1.2
  text "a" at -26.033,1.467 h1.2
Drill Drawing:
  lines w0.1: -35.45,-37.2 -24.7,-37.2 -24.7,0.8 -35.45,0.8 -35.45,-37.2 ; -1,-37 -1,1 9.75,1 9.75,-37 -1,-37
  text "PRESS-FIT TECHNOLOGY diam. 0.6mm +/- 0.05" at -1.5,-36.1 h1
  text "PRESS-FIT TECHNOLOGY diam. 0.6mm +/- 0.05" at -23.15,-36.575 h1
3D body "HARTING_17 25 095 2101_a.stp": height 7.68, standoff -3.67, extent -10.7,-36.95 9.75,0.95
3D body "HARTING_17 25 095 2101.stp": height 7.68, standoff -3.67, extent -35.45,-37.15 -15,0.75